# Altium footprint library 04.连接器件.pcb.PCBLIB: 363 footprints (part 20 of 23)
Each footprint in its own frame and in the unit in brackets; x right, y up, seen from the top. Pads: shape width x height; smd on the part's side, far side on the other; paste and mask are expansions set on the pad; w line width, h text height; cw(c..) or ccw(c..) is an arc to the next point about the centre after c.
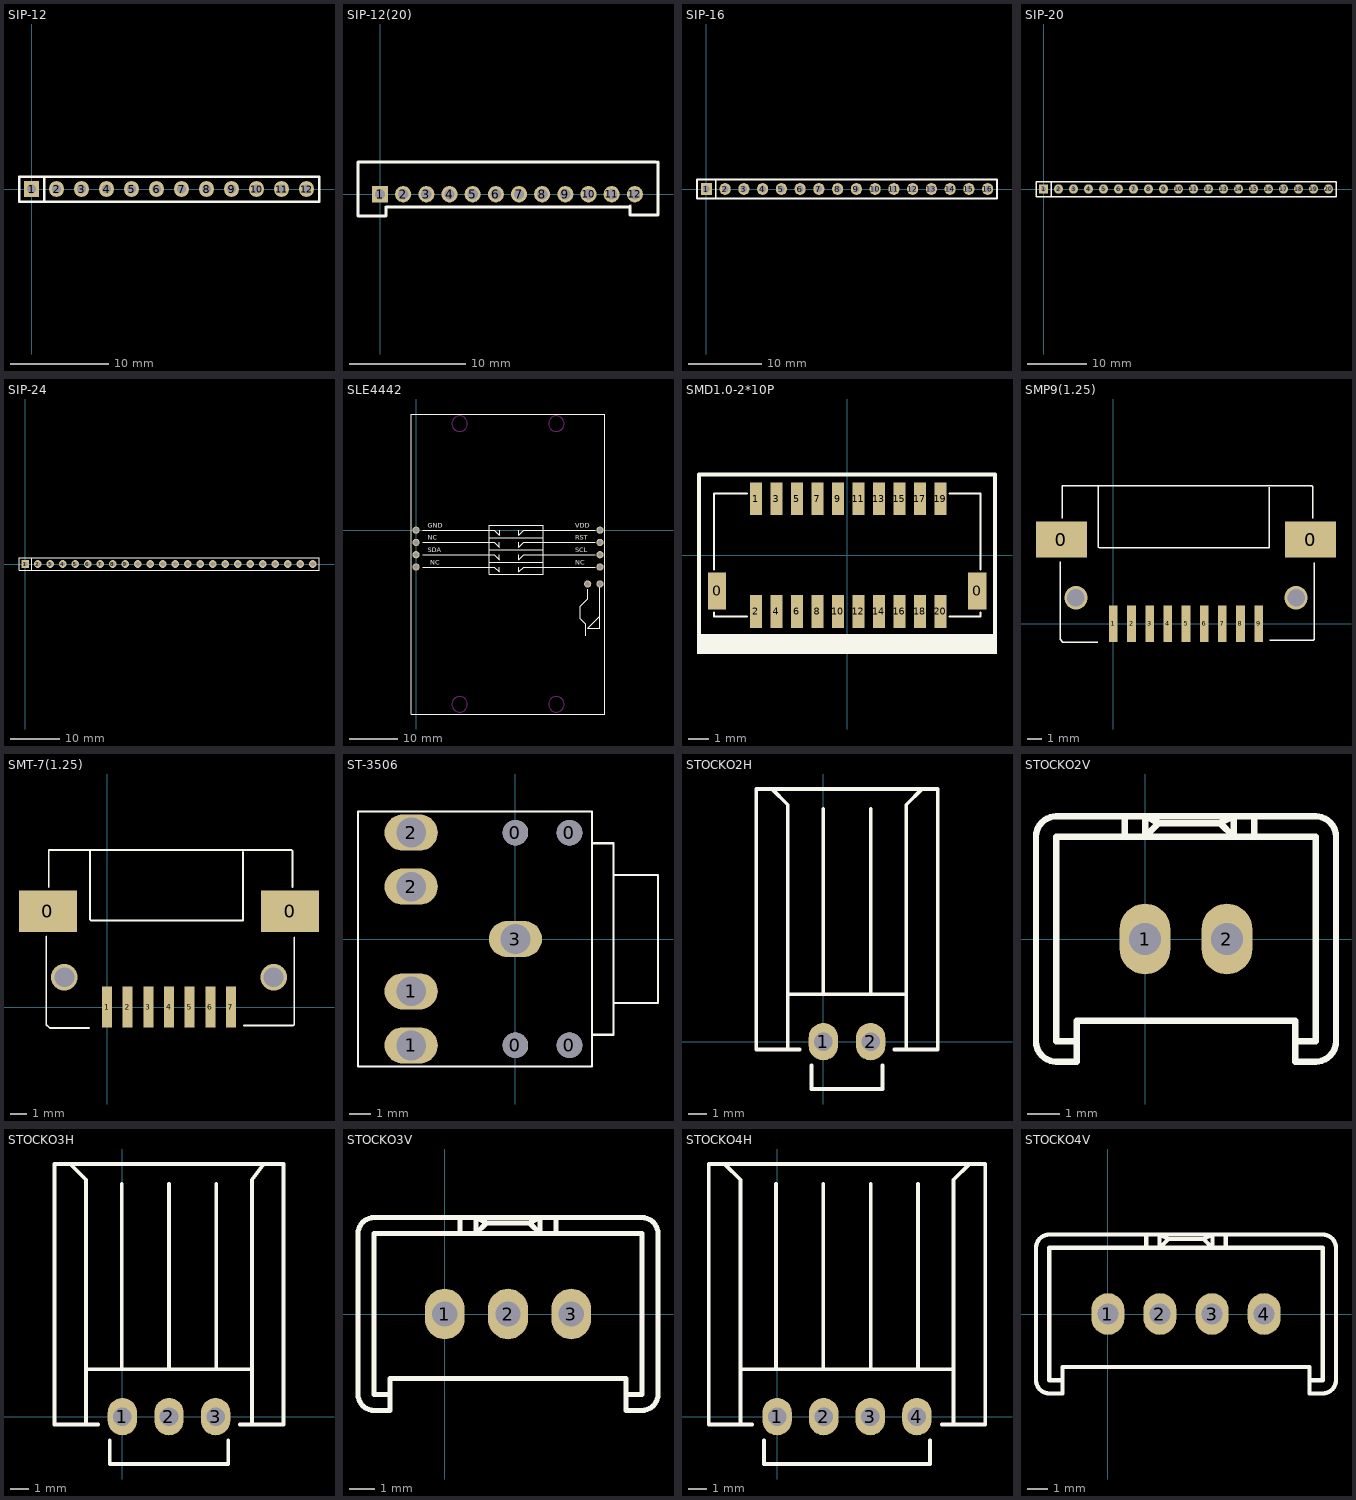
[diagram p19: the footprints below, top view; thin cyan lines are the x and y axes]

## SIP-12 [mm]
pads (12):
  rect 1.5x1.6 hole 0.9: 1(0,0)
  oval 1.5x1.6 hole 0.9: 2(2.54,0) 3(5.08,0) 4(7.62,0) 5(10.16,0) 6(12.7,0) 7(15.24,0) 8(17.78,0) 9(20.32,0) 10(22.86,0) 11(25.4,0) 12(27.94,0)
TopOverlay:
  lines w0.254: 1.27,-1.27 1.27,1.27 ; -1.27,-1.27 29.21,-1.27 29.21,1.27 -1.27,1.27 -1.27,-1.27

## SIP-12(20) [mm]
pads (12):
  rect 1.4x1.4 hole 0.9: 1(0,0)
  round 1.4 hole 0.9: 2(2,0) 3(4,0) 4(6,0) 5(8,0) 6(10,0) 7(12,0) 8(14,0) 9(16,0) 10(18,0) 11(20,0) 12(22,0)
TopOverlay:
  lines w0.254: 21.501,-1.1 0.5,-1.1 ; 23.816,2.8 -1.9,2.8 -1.9,-1.9 0.5,-1.9 0.5,-1.1 ; 24,2.8 24,-1.8 ; 0.5,-1.1 0.5,-1.1 ; 21.6,-1 21.6,-1.8 24,-1.8 ; 21.6,-1 21.6,-1 ; 24,-1.8 24,-1.8 ; 22,-1.8 22,-1.8

## SIP-16 [mm]
pads (16):
  rect 1.5x1.6 hole 0.9: 1(0,0)
  oval 1.5x1.6 hole 0.9: 2(2.54,0) 3(5.08,0) 4(7.62,0) 5(10.16,0) 6(12.7,0) 7(15.24,0) 8(17.78,0) 9(20.32,0) 10(22.86,0) 11(25.4,0) 12(27.94,0) 13(30.48,0) 14(33.02,0) 15(35.56,0) 16(38.1,0)
TopOverlay:
  lines w0.254: 1.27,-1.27 1.27,1.27 ; -1.27,-1.27 39.37,-1.27 39.37,1.27 -1.27,1.27 -1.27,-1.27

## SIP-20 [mm]
pads (20):
  rect 1.5x1.6 hole 0.9: 1(0,0)
  oval 1.5x1.6 hole 0.9: 2(2.54,0) 3(5.08,0) 4(7.62,0) 5(10.16,0) 6(12.7,0) 7(15.24,0) 8(17.78,0) 9(20.32,0) 10(22.86,0) 11(25.4,0) 12(27.94,0) 13(30.48,0) 14(33.02,0) 15(35.56,0) 16(38.1,0) 17(40.64,0) 18(43.18,0) 19(45.72,0) 20(48.26,0)
TopOverlay:
  lines w0.254: 1.27,-1.27 1.27,1.27 ; -1.27,-1.27 49.53,-1.27 49.53,1.27 -1.27,1.27 -1.27,-1.27

## SIP-24 [mm]
pads (24):
  rect 1.5x1.6 hole 0.9: 1(0,0)
  oval 1.5x1.6 hole 0.9: 2(2.54,0) 3(5.08,0) 4(7.62,0) 5(10.16,0) 6(12.7,0) 7(15.24,0) 8(17.78,0) 9(20.32,0) 10(22.86,0) 11(25.4,0) 12(27.94,0) 13(30.48,0) 14(33.02,0) 15(35.56,0) 16(38.1,0) 17(40.64,0) 18(43.18,0) 19(45.72,0) 20(48.26,0) 21(50.8,0) 22(53.34,0) 23(55.88,0) 24(58.42,0)
TopOverlay:
  lines w0.254: 1.27,-1.27 1.27,1.27 ; -1.27,-1.27 59.69,-1.27 59.69,1.27 -1.27,1.27 -1.27,-1.27

## SLE4442 [mm]
pads (10):
  round 1.5 hole 1: 1(0,0) 2(0,-2.54) 3(0,-5.08) 4(0,-7.62) 5(38,-7.62) 6(38,-5.08) 7(38,-2.54) 8(38,0) 9(38,-11.12) 10(35.46,-11.12)
TopOverlay:
  lines w0.127: 1.424,-7.62 16.156,-7.62 17.172,-8.636 17.172,-7.62 ; 1.424,-5.08 16.156,-5.08 17.172,-6.096 17.172,-5.08 ; 1.424,-2.54 16.156,-2.54 17.172,-3.556 17.172,-2.54 ; 1.424,0 16.156,0 17.172,-1.016 17.172,0 ; 15.14,-6.604 26.316,-6.604 ; 15.14,-4.064 26.316,-4.064 ; 15.14,-1.524 26.316,-1.524 ; 21.236,-7.62 21.236,-8.636 22.252,-7.62 36.984,-7.62 ; 21.236,-5.08 21.236,-6.096 22.252,-5.08 36.984,-5.08 ; 21.236,-2.54 21.236,-3.556 22.252,-2.54 36.984,-2.54 ; 21.236,0 21.236,-1.016 22.252,0 36.984,0 ; 34.952,-21.844 34.952,-19.304 33.936,-18.288 33.936,-15.748 35.46,-14.224 35.46,-12.192 ; 35.443,-20.32 37.983,-17.78 ; 35.46,-20.32 37.983,-20.32 37.983,-11.176 ; 15.14,-9.144 26.316,-9.144 26.316,1.016 15.14,1.016 15.14,-9.144
  lines w0.254: -1,-38 39,-38 39,24 -1,24 -1,-38
  text "GND" at 2.44,0.508 h1
  text "NC" at 2.44,-2.032 h1
  text "SDA" at 2.44,-4.572 h1
  text "NC" at 2.948,-7.112 h1
  text "NC" at 32.92,-7.112 h1
  text "SCL" at 32.92,-4.572 h1
  text "RST" at 32.92,-2.032 h1
  text "VDD" at 32.92,0.508 h1
KeepOutLayer:
  circle w0.1: c29,-36 r1.6
  circle w0.1: c29,22 r1.6
  circle w0.1: c9,22 r1.6
  circle w0.1: c9,-36 r1.6

## SMD1.0-2*10P [mm]
pads (22):
  rect 0.9x1.8 smd: 0(-6.35,-1.744) 0(6.35,-1.745)
  rect 0.6x1.6 smd: 1(-4.45,2.75) 2(-4.45,-2.75) 3(-3.45,2.75) 4(-3.45,-2.75) 5(-2.45,2.75) 6(-2.45,-2.75) 7(-1.45,2.75) 8(-1.45,-2.75) 9(-0.45,2.75) 10(-0.45,-2.75) 11(0.55,2.75) 12(0.55,-2.75) 13(1.55,2.75) 14(1.55,-2.75) 15(2.55,2.75) 16(2.55,-2.75) 17(3.55,2.75) 18(3.55,-2.75) 19(4.55,2.75) 20(4.55,-2.75)
TopOverlay:
  region: 7.312,-4.806 7.312,-3.914 -7.327,-3.914 -7.327,-4.806
  lines w0.1: -6.5,-2.8 -6.5,-3 -4.9,-3 ; -6.5,-0.7 -6.5,3 -4.9,3 ; 5,-3 6.5,-3 6.5,-2.8 ; 5,3 6.5,3 6.5,-0.7
  lines w0.2: -7.229,-3.962 -7.229,3.935 -2.696,3.935 7.212,3.935 7.212,-2.743 7.212,-3.962 -1.18,-3.962 -7.229,-3.962
3D body: height 5.5, standoff 0, extent -6.5,-3 6.5,3

## SMP9(1.25) [mm]
pads (11):
  rect 3.5x2.5 smd: 0(-3.575,5.8) 0(13.575,5.8)
  rect 0.6x2.5 smd: 1(0,0) 2(1.25,0) 3(2.5,0) 4(3.75,0) 5(5,0) 6(6.25,0) 7(7.5,0) 8(8.75,0) 9(10,0)
via 12.575,1.8 diameter 1.6 hole 1.2
via -2.575,1.8 diameter 1.6 hole 1.2
TopOverlay:
  lines w0.1: -3.67,4.267 -3.67,-1.067 -3.467,-1.27 -1.079,-1.27 ; -3.517,7.264 -3.517,9.5 13.67,9.5 13.721,9.449 13.721,7.264 ; -1.028,9.5 -1.028,5.283 -0.977,5.232 10.723,5.232 10.723,9.398 ; 10.774,-1.118 13.771,-1.118 13.822,-1.067 13.822,4.216

## SMT-7(1.25) [mm]
pads (9):
  rect 3.5x2.5 smd: 0(-3.575,5.8) 0(11.075,5.8)
  rect 0.6x2.5 smd: 1(0,0) 2(1.25,0) 3(2.5,0) 4(3.75,0) 5(5,0) 6(6.25,0) 7(7.5,0)
via -2.575,1.8 diameter 1.6 hole 1.2
via 10.075,1.8 diameter 1.6 hole 1.2
TopOverlay:
  lines w0.1: -3.67,4.267 -3.67,-1.067 -3.467,-1.27 -1.079,-1.27 ; -3.517,7.264 -3.517,9.5 ; -1.028,9.5 -1.028,5.283 -0.977,5.232 ; 8.223,5.232 8.223,9.398 ; 8.274,-1.118 11.271,-1.118 11.322,-1.067 11.322,4.216 ; 11.17,9.5 11.221,9.449 11.221,7.264
  lines w0.127: -3.517,9.5 11.17,9.5 ; -0.977,5.232 8.223,5.232

## ST-3506 [mm]
pads (9):
  round 1.2 hole 1.2: 0(0,-5) 0(0,5) 0(2.54,-5) 0(2.54,5)
  oval 2.5x1.7 hole 1.4: 1(-4.9,-5) 1(-4.9,-2.46) 2(-4.9,2.46) 2(-4.9,5) 3(0,0)
TopOverlay:
  lines w0.1: 3.6,-4.5 4.6,-4.5 4.6,-3 ; 3.6,-4.5 3.6,-6 -7.4,-6 -7.4,6 3.6,6 3.6,4.5 ; 3.6,-4.5 3.6,4.5 ; 3.6,4.5 4.6,4.5 4.6,3 ; 4.6,-3 6.7,-3 6.7,3 4.6,3 ; 4.6,-3 4.6,3

## STOCKO2H [mm]
pads (2):
  oval 1.575x2 hole 1: 1(0,0) 2(2.54,0)
TopOverlay:
  lines w0.2: -2.752,13.547 -1.905,12.7 -1.905,-0.423 ; -1.905,2.54 4.445,2.54 ; -1.27,-0.423 -3.598,-0.423 -3.598,13.547 6.138,13.547 6.138,-0.423 3.81,-0.423 ; -0.635,-1.27 -0.635,-2.54 3.175,-2.54 3.175,-1.27 ; 0,2.54 0,12.488 ; 2.54,2.54 2.54,12.488 ; 4.445,-0.423 4.445,12.7 5.292,13.547

## STOCKO2V [mm]
pads (2):
  oval 1.575x2.2 hole 1: 1(0,0) 2(2.54,0)
TopOverlay:
  lines w0.2: -2.117,-3.175 -2.752,-3.175 -2.752,3.175 5.292,3.175 5.292,-3.175 4.657,-3.175 ; -0.635,3.175 -0.635,3.81 ; 3.387,3.175 3.387,3.81 ; 0.423,3.598 0,3.175 0,3.81 0.423,3.598 ; 0.423,3.598 2.117,3.598 2.328,3.598 ; 2.328,3.598 2.752,3.175 2.752,3.81 2.328,3.598 ; -3.387,-3.175 ccw(c-2.752,-3.175) -2.752,-3.81 -2.117,-3.81 -2.117,-2.54 4.657,-2.54 4.657,-3.81 5.292,-3.81 ccw(c5.292,-3.175) 5.927,-3.175 5.927,3.175 ccw(c5.292,3.175) 5.292,3.81 -2.752,3.81 ccw(c-2.752,3.175) -3.387,3.175 -3.387,-3.175

## STOCKO3H [mm]
pads (3):
  oval 1.575x2 hole 1: 1(0,0) 2(2.498,0) 3(4.995,0)
TopOverlay:
  lines w0.2: -2.794,13.547 -1.947,12.7 -1.947,-0.423 ; -1.947,2.54 6.943,2.54 ; -1.312,-0.423 -3.641,-0.423 -3.641,13.547 8.636,13.547 8.636,-0.423 6.308,-0.423 ; -0.677,-1.27 -0.677,-2.54 5.673,-2.54 5.673,-1.27 ; -0.042,2.54 -0.042,12.488 ; 2.498,2.54 2.498,12.488 ; 5.038,2.54 5.038,12.488 ; 6.943,-0.423 6.943,12.7 7.578,13.547

## STOCKO3V [mm]
pads (3):
  oval 1.575x2 hole 1: 1(0,0) 2(2.498,0) 3(4.995,0)
TopOverlay:
  lines w0.2: 0.593,3.175 0.593,3.81 ; 4.403,3.175 4.403,3.81 ; -2.159,-3.175 -2.159,-2.54 7.154,-2.54 7.154,-3.175 ; -2.159,-3.175 -2.794,-3.175 -2.794,3.175 7.789,3.175 7.789,-3.175 7.154,-3.175 ; -2.159,-3.175 -2.159,-3.81 -2.794,-3.81 cw(c-2.794,-3.175) -3.429,-3.175 -3.429,3.175 cw(c-2.794,3.175) -2.794,3.81 7.789,3.81 cw(c7.789,3.175) 8.424,3.175 8.424,-3.175 cw(c7.789,-3.175) 7.789,-3.81 7.154,-3.81 7.154,-3.175 ; 1.651,3.598 1.228,3.81 1.228,3.175 1.651,3.598 ; 1.651,3.598 3.344,3.598 ; 3.344,3.598 3.768,3.81 3.768,3.175 3.344,3.598

## STOCKO4H [mm]
pads (4):
  oval 1.575x2 hole 1: 1(0,0) 2(2.498,0) 3(4.995,0) 4(7.493,0)
TopOverlay:
  lines w0.2: -2.815,13.547 -1.968,12.7 -1.968,-0.423 ; -1.968,2.54 9.461,2.54 ; -1.333,-0.423 -3.662,-0.423 -3.662,13.547 11.155,13.547 11.155,-0.423 8.826,-0.423 ; -0.699,-1.27 -0.699,-2.54 8.191,-2.54 8.191,-1.27 ; -0.064,2.54 -0.064,12.488 ; 2.476,2.54 2.476,12.488 ; 5.016,2.54 5.016,12.488 ; 7.556,2.54 7.556,12.488 ; 9.461,-0.423 9.461,12.7 10.308,13.547

## STOCKO4V [mm]
pads (4):
  oval 1.575x2 hole 1: 1(0,0) 2(2.498,0) 3(4.995,0) 4(7.493,0)
TopOverlay:
  lines w0.2: -3.45,-3.175 -3.45,3.175 ; -2.815,-3.81 -2.18,-3.81 -2.18,-2.54 9.673,-2.54 9.673,-3.81 10.308,-3.81 ; -2.815,3.81 10.308,3.81 ; -2.18,-3.175 -2.815,-3.175 -2.815,3.175 10.308,3.175 10.308,-3.175 9.673,-3.175 ; 1.841,3.175 1.841,3.81 ; 5.651,3.175 5.651,3.81 ; 10.943,-3.175 10.943,3.175 ; 2.9,3.598 2.476,3.175 2.476,3.81 2.9,3.598 ; 2.9,3.598 4.593,3.598 ; 4.593,3.598 5.016,3.175 5.016,3.81 4.593,3.598
  lines w0.203: -3.45,-3.175 ccw(c-2.815,-3.175) -2.815,-3.81 ; -3.45,3.175 cw(c-2.815,3.175) -2.815,3.81 ; 10.308,-3.81 ccw(c10.308,-3.175) 10.943,-3.175 ; 10.308,3.81 cw(c10.308,3.175) 10.943,3.175